# Altium footprint library Generic Footprint.PcbLib: 160 footprints (part 15 of 20) (continued)
## Symbol_FCC-Logo-3x2mm_Silkscreen [mm] (continued)
1(0.376,0.862) 1(0.376,0.865) 1(0.376,0.869) 1(0.376,0.872) 1(0.376,0.875) 1(0.376,0.879) 1(0.376,0.882) 1(0.376,0.886) 1(0.376,0.889) 1(0.376,0.892) 1(0.376,0.896) 1(0.376,0.899) 1(0.376,0.903) 1(0.376,0.906) 1(0.376,0.913) 1(0.376,1.181) 1(0.376,1.722) 1(0.376,1.725) 1(0.376,1.729) 1(0.376,1.732) 1(0.376,1.736) 1(0.376,1.739) 1(0.379,0.913) 1(0.379,0.916) 1(0.379,0.92) 1(0.379,1.181) 1(0.379,1.725) 1(0.379,1.729) 1(0.379,1.732) 1(0.379,1.742) 1(0.382,0.926) 1(0.382,1.178) 1(0.382,1.185) 1(0.382,1.739) 1(0.382,1.742) 1(0.382,1.749) 1(0.386,1.739) 1(0.386,1.742) 1(0.386,1.746) 1(0.386,1.749) 1(0.389,1.756) 1(0.393,1.749) 1(0.393,1.756) 1(0.393,1.759) 1(0.396,0.92) 1(0.396,0.923) 1(0.396,0.926) 1(0.396,1.753) 1(0.396,1.759) 1(0.399,1.763) 1(0.403,1.756) 1(0.403,1.763) 1(0.406,1.759) 1(0.41,1.763) 1(0.413,1.766) 1(0.413,1.773) 1(0.42,1.77) 1(0.42,1.773) 1(0.42,1.776) 1(0.427,1.773) 1(0.427,1.776) 1(0.427,1.78) 1(1.035,1.178) 1(1.035,1.185) 1(1.039,0.923) 1(1.042,0.892) 1(1.042,0.896) 1(1.042,0.899) 1(1.042,0.903) 1(1.042,0.906) 1(1.042,0.909) 1(1.042,0.913) 1(1.042,0.916) 1(1.042,1.185) 1(1.042,1.195) 1(1.042,1.198) 1(1.042,1.202) 1(1.042,1.205) 1(1.042,1.209) 1(1.042,1.212) 1(1.045,0.869) 1(1.045,0.872) 1(1.045,0.875) 1(1.045,0.879) 1(1.045,0.882) 1(1.045,0.886) 1(1.045,0.892) 1(1.045,0.896) 1(1.045,0.899) 1(1.045,0.903) 1(1.045,0.906) 1(1.045,0.909) 1(1.045,0.913) 1(1.045,1.185) 1(1.045,1.188) 1(1.045,1.195) 1(1.045,1.198) 1(1.045,1.202) 1(1.045,1.205) 1(1.045,1.209) 1(1.045,1.212) 1(1.045,1.219) 1(1.045,1.222) 1(1.045,1.226) 1(1.045,1.229) 1(1.045,1.232) 1(1.049,0.852) 1(1.049,0.855) 1(1.049,0.858) 1(1.049,0.862) 1(1.049,0.869) 1(1.049,0.872) 1(1.049,0.875) 1(1.049,0.879) 1(1.049,0.882) 1(1.049,0.886) 1(1.049,0.889) 1(1.049,0.892) 1(1.049,0.896) 1(1.049,0.899) 1(1.049,0.903) 1(1.049,0.906) 1(1.049,0.909) 1(1.049,0.913) 1(1.049,1.192) 1(1.049,1.195) 1(1.049,1.198) 1(1.049,1.202) 1(1.049,1.205) 1(1.049,1.209) 1(1.049,1.212) 1(1.049,1.215) 1(1.049,1.219) 1(1.049,1.222) 1(1.049,1.226) 1(1.049,1.229) 1(1.049,1.232) 1(1.049,1.239) 1(1.049,1.243) 1(1.049,1.246) 1(1.049,1.249) 1(1.049,1.253) 1(1.052,0.838) 1(1.052,0.845) 1(1.052,0.886) 1(1.052,1.219) 1(1.052,1.253) 1(1.052,1.256) 1(1.052,1.27) 1(1.056,0.818) 1(1.056,0.821) 1(1.056,0.824) 1(1.056,0.828) 1(1.056,0.831) 1(1.056,0.835) 1(1.056,0.841) 1(1.056,0.852) 1(1.056,0.855) 1(1.056,0.858) 1(1.056,0.862) 1(1.056,0.865) 1(1.056,0.869) 1(1.056,0.872) 1(1.056,0.875) 1(1.056,0.879) 1(1.056,0.882) 1(1.056,1.222) 1(1.056,1.226) 1(1.056,1.229) 1(1.056,1.232) 1(1.056,1.236) 1(1.056,1.239) 1(1.056,1.243) 1(1.056,1.246) 1(1.056,1.249) 1(1.056,1.256) 1(1.056,1.26) 1(1.056,1.263) 1(1.056,1.266) 1(1.056,1.273) 1(1.056,1.277) 1(1.056,1.28) 1(1.056,1.283) 1(1.056,1.287) 1(1.059,0.804) 1(1.059,0.807) 1(1.059,0.811) 1(1.059,0.814) 1(1.059,0.835) 1(1.059,0.838) 1(1.059,0.841) 1(1.059,0.845) 1(1.059,0.848) 1(1.059,0.852) 1(1.059,0.855) 1(1.059,0.858) 1(1.059,0.862) 1(1.059,1.239) 1(1.059,1.243) 1(1.059,1.246) 1(1.059,1.249) 1(1.059,1.253) 1(1.059,1.256) 1(1.059,1.26) 1(1.059,1.263) 1(1.059,1.266) 1(1.059,1.27) 1(1.059,1.273) 1(1.059,1.29) 1(1.059,1.294) 1(1.059,1.297) 1(1.059,1.3) 1(1.062,0.787) 1(1.062,0.79) 1(1.062,0.794) 1(1.062,0.797) 1(1.062,0.801) 1(1.062,0.818) 1(1.062,0.828) 1(1.062,0.835) 1(1.062,0.838) 1(1.062,0.841) 1(1.062,0.845) 1(1.062,1.26) 1(1.062,1.263) 1(1.062,1.266) 1(1.062,1.27) 1(1.062,1.273) 1(1.062,1.28) 1(1.062,1.283) 1(1.062,1.287) 1(1.062,1.304) 1(1.062,1.307) 1(1.062,1.311) 1(1.062,1.314) 1(1.062,1.317) 1(1.066,0.818) 1(1.066,0.828) 1(1.066,1.28) 1(1.066,1.283) 1(1.066,1.287) 1(1.069,0.777) 1(1.069,0.78) 1(1.069,0.784) 1(1.069,1.321) 1(1.069,1.324) 1(1.069,1.328) 1(1.073,0.76) 1(1.073,0.763) 1(1.073,0.767) 1(1.073,0.77) 1(1.073,0.777) 1(1.073,0.78) 1(1.073,1.324) 1(1.073,1.328) 1(1.073,1.334) 1(1.073,1.338) 1(1.073,1.341) 1(1.073,1.345) 1(1.076,0.75) 1(1.076,0.753) 1(1.076,0.76) 1(1.076,0.763) 1(1.076,0.767) 1(1.076,0.77) 1(1.076,0.773) 1(1.076,0.777) 1(1.076,0.78) 1(1.076,1.324) 1(1.076,1.328) 1(1.076,1.334) 1(1.076,1.338) 1(1.076,1.341) 1(1.076,1.345) 1(1.076,1.351) 1(1.079,0.739) 1(1.079,0.743) 1(1.079,0.75) 1(1.079,0.753) 1(1.079,0.76) 1(1.079,0.763) 1(1.079,0.767) 1(1.079,0.77) 1(1.079,1.331) 1(1.079,1.334) 1(1.079,1.338) 1(1.079,1.341) 1(1.079,1.345) 1(1.079,1.351) 1(1.079,1.358) 1(1.079,1.362) 1(1.079,1.365) 1(1.083,0.726) 1(1.083,0.729) 1(1.083,0.733) 1(1.083,0.739) 1(1.083,0.743) 1(1.083,0.75) 1(1.083,0.753) 1(1.083,0.756) 1(1.083,1.348) 1(1.083,1.351) 1(1.083,1.355) 1(1.083,1.358) 1(1.083,1.362) 1(1.083,1.365) 1(1.083,1.372) 1(1.083,1.375) 1(1.086,0.719) 1(1.086,0.722) 1(1.086,0.746) 1(1.086,1.358) 1(1.086,1.368) 1(1.086,1.375) 1(1.086,1.379) 1(1.086,1.382) 1(1.086,1.385) 1(1.09,0.705) 1(1.09,0.709) 1(1.09,0.712) 1(1.09,0.716) 1(1.09,0.726) 1(1.09,0.729) 1(1.09,0.736) 1(1.09,0.739) 1(1.09,0.743) 1(1.09,1.362) 1(1.09,1.365) 1(1.09,1.372) 1(1.09,1.389) 1(1.09,1.392) 1(1.09,1.396) 1(1.09,1.399) 1(1.09,2.13) 1(1.093,0.692) 1(1.093,0.695) 1(1.093,0.699) 1(1.093,0.702) 1(1.093,0.716) 1(1.093,0.719) 1(1.093,0.726) 1(1.093,0.729) 1(1.093,1.372) 1(1.093,1.375) 1(1.093,1.382) 1(1.093,1.385) 1(1.093,1.389) 1(1.093,1.402) 1(1.093,1.406) 1(1.093,1.409) 1(1.093,2.123) 1(1.093,2.127) 1(1.093,2.13) 1(1.096,0.688) 1(1.096,0.692) 1(1.096,0.695) 1(1.096,0.716) 1(1.096,0.719) 1(1.096,1.382) 1(1.096,1.385) 1(1.096,1.389) 1(1.096,1.409) 1(1.096,1.413) 1(1.096,1.416) 1(1.096,1.787) 1(1.096,1.79) 1(1.096,1.793) 1(1.096,1.797) 1(1.096,1.8) 1(1.096,1.804) 1(1.096,1.807) 1(1.096,1.81) 1(1.096,1.814) 1(1.096,1.817) 1(1.096,1.821) 1(1.096,1.824) 1(1.096,1.827) 1(1.096,1.831) 1(1.096,1.834) 1(1.096,1.838) 1(1.096,1.841) 1(1.096,1.844) 1(1.096,1.848) 1(1.096,1.851) 1(1.096,1.855) 1(1.096,1.858) 1(1.096,1.861) 1(1.096,1.865) 1(1.096,1.868) 1(1.096,1.872) 1(1.096,1.875) 1(1.096,1.878) 1(1.096,1.882) 1(1.096,1.885) 1(1.096,1.889) 1(1.096,1.892) 1(1.096,1.895) 1(1.096,1.899) 1(1.096,1.902) 1(1.096,1.906) 1(1.096,1.909) 1(1.096,1.912) 1(1.096,1.916) 1(1.096,1.919) 1(1.096,1.923) 1(1.096,1.926) 1(1.096,1.929) 1(1.096,1.933) 1(1.096,1.936) 1(1.096,1.94) 1(1.096,1.943) 1(1.096,1.946) 1(1.096,1.95) 1(1.096,1.953) 1(1.096,1.957) 1(1.096,1.96) 1(1.096,1.963) 1(1.096,1.967) 1(1.096,1.97) 1(1.096,1.974) 1(1.096,1.977) 1(1.096,1.98) 1(1.096,1.984) 1(1.096,1.987) 1(1.096,1.991) 1(1.096,1.994) 1(1.096,1.997) 1(1.096,2.001) 1(1.096,2.004) 1(1.096,2.008) 1(1.096,2.011) 1(1.096,2.014) 1(1.096,2.018) 1(1.096,2.021) 1(1.096,2.025) 1(1.096,2.028) 1(1.096,2.031) 1(1.096,2.035) 1(1.096,2.038) 1(1.096,2.042) 1(1.096,2.045) 1(1.096,2.048) 1(1.096,2.052) 1(1.096,2.055) 1(1.096,2.059) 1(1.096,2.062) 1(1.096,2.065) 1(1.096,2.069) 1(1.096,2.072) 1(1.096,2.076) 1(1.096,2.079) 1(1.096,2.082) 1(1.096,2.086) 1(1.096,2.089) 1(1.096,2.093) 1(1.096,2.096) 1(1.096,2.099) 1(1.096,2.103) 1(1.096,2.106) 1(1.096,2.11) 1(1.096,2.113) 1(1.096,2.116) 1(1.096,2.12) 1(1.096,2.123) 1(1.096,2.127) 1(1.096,2.13) 1(1.096,2.133) 1(1.1,0.688) 1(1.1,0.692) 1(1.1,0.695) 1(1.1,1.409) 1(1.1,1.416) 1(1.1,1.426) 1(1.1,1.787) 1(1.1,1.79) 1(1.1,1.793) 1(1.1,1.797) 1(1.1,1.8) 1(1.1,1.804) 1(1.1,1.807) 1(1.1,1.81) 1(1.1,1.814) 1(1.1,1.817) 1(1.1,1.821) 1(1.1,1.824) 1(1.1,1.827) 1(1.1,1.831) 1(1.1,1.834) 1(1.1,1.838) 1(1.1,1.841) 1(1.1,1.844) 1(1.1,1.848) 1(1.1,1.851) 1(1.1,1.855) 1(1.1,1.858) 1(1.1,1.861) 1(1.1,1.865) 1(1.1,1.868) 1(1.1,1.872) 1(1.1,1.875) 1(1.1,1.878) 1(1.1,1.882) 1(1.1,1.885) 1(1.1,1.889) 1(1.1,1.892) 1(1.1,1.895) 1(1.1,1.899) 1(1.1,1.902) 1(1.1,1.906) 1(1.1,1.909) 1(1.1,1.912) 1(1.1,1.916) 1(1.1,1.919) 1(1.1,1.923) 1(1.1,1.926) 1(1.1,1.929) 1(1.1,1.933) 1(1.1,1.936) 1(1.1,1.94) 1(1.1,1.943) 1(1.1,1.946) 1(1.1,1.95) 1(1.1,1.953) 1(1.1,1.957) 1(1.1,1.96) 1(1.1,1.963) 1(1.1,1.967) 1(1.1,1.97) 1(1.1,1.974) 1(1.1,1.977) 1(1.1,1.98) 1(1.1,1.984) 1(1.1,1.987) 1(1.1,1.991) 1(1.1,1.994) 1(1.1,1.997) 1(1.1,2.001) 1(1.1,2.004) 1(1.1,2.008) 1(1.1,2.011) 1(1.1,2.014) 1(1.1,2.018) 1(1.1,2.021) 1(1.1,2.025) 1(1.1,2.028) 1(1.1,2.031) 1(1.1,2.035) 1(1.1,2.038) 1(1.1,2.042) 1(1.1,2.045) 1(1.1,2.048) 1(1.1,2.052) 1(1.1,2.055) 1(1.1,2.059) 1(1.1,2.062) 1(1.1,2.065) 1(1.1,2.069) 1(1.1,2.072) 1(1.1,2.076) 1(1.1,2.079) 1(1.1,2.082) 1(1.1,2.086) 1(1.1,2.089) 1(1.1,2.093) 1(1.1,2.096) 1(1.1,2.099) 1(1.1,2.103) 1(1.1,2.106) 1(1.1,2.11) 1(1.1,2.113) 1(1.1,2.116) 1(1.1,2.123) 1(1.1,2.127) 1(1.103,0.675) 1(1.103,0.678) 1(1.103,0.682) 1(1.103,1.423) 1(1.103,1.43) 1(1.103,1.787) 1(1.103,1.79) 1(1.103,1.793) 1(1.103,1.797) 1(1.103,1.8) 1(1.103,1.804) 1(1.103,1.807) 1(1.103,1.81) 1(1.103,1.814) 1(1.103,1.817) 1(1.103,1.821) 1(1.103,1.824) 1(1.103,1.827) 1(1.103,1.831) 1(1.103,1.834) 1(1.103,1.838) 1(1.103,1.841) 1(1.103,1.844) 1(1.103,1.848) 1(1.103,1.851) 1(1.103,1.855) 1(1.103,1.858) 1(1.103,1.861) 1(1.103,1.865) 1(1.103,1.868) 1(1.103,1.872) 1(1.103,1.875) 1(1.103,1.878) 1(1.103,1.882) 1(1.103,1.885) 1(1.103,1.889) 1(1.103,1.892) 1(1.103,1.895) 1(1.103,1.899) 1(1.103,1.902) 1(1.103,1.906) 1(1.103,1.909) 1(1.103,1.912) 1(1.103,1.916) 1(1.103,1.919) 1(1.103,1.923) 1(1.103,1.926) 1(1.103,1.929) 1(1.103,1.933) 1(1.103,1.936) 1(1.103,1.94) 1(1.103,1.943) 1(1.103,1.946) 1(1.103,1.95) 1(1.103,1.953) 1(1.103,1.957) 1(1.103,1.96) 1(1.103,1.963) 1(1.103,1.967) 1(1.103,1.97) 1(1.103,1.974) 1(1.103,1.977) 1(1.103,1.98) 1(1.103,1.984) 1(1.103,1.987) 1(1.103,1.991) 1(1.103,1.994) 1(1.103,1.997) 1(1.103,2.001) 1(1.103,2.004) 1(1.103,2.008) 1(1.103,2.011) 1(1.103,2.014) 1(1.103,2.018) 1(1.103,2.021) 1(1.103,2.025) 1(1.103,2.028) 1(1.103,2.031) 1(1.103,2.035) 1(1.103,2.038) 1(1.103,2.042) 1(1.103,2.045) 1(1.103,2.048) 1(1.103,2.052) 1(1.103,2.055) 1(1.103,2.059) 1(1.103,2.062) 1(1.103,2.065) 1(1.103,2.069) 1(1.103,2.072) 1(1.103,2.076) 1(1.103,2.079) 1(1.103,2.082) 1(1.103,2.086) 1(1.103,2.089) 1(1.103,2.093) 1(1.103,2.096) 1(1.103,2.099) 1(1.103,2.103) 1(1.103,2.106) 1(1.103,2.11) 1(1.103,2.113) 1(1.107,0.668) 1(1.107,0.675) 1(1.107,0.678) 1(1.107,0.682) 1(1.107,0.685) 1(1.107,0.688) 1(1.107,1.416) 1(1.107,1.419) 1(1.107,1.423) 1(1.107,1.426) 1(1.107,1.43) 1(1.107,1.436) 1(1.107,1.78) 1(1.107,1.783) 1(1.107,2.116) 1(1.11,0.651) 1(1.11,0.658) 1(1.11,0.661) 1(1.11,0.668) 1(1.11,0.675) 1(1.11,0.678) 1(1.11,0.682) 1(1.11,1.423) 1(1.11,1.426) 1(1.11,1.43) 1(1.11,1.436) 1(1.11,1.443) 1(1.11,1.447) 1(1.11,1.78) 1(1.113,0.644) 1(1.113,0.658) 1(1.113,0.661) 1(1.113,0.668) 1(1.113,0.671) 1(1.113,1.433) 1(1.113,1.436) 1(1.113,1.443) 1(1.113,1.447) 1(1.113,1.453) 1(1.113,1.464) 1(1.113,1.776) 1(1.117,0.641) 1(1.117,0.651) 1(1.117,0.654) 1(1.117,0.658) 1(1.117,0.661) 1(1.117,0.665) 1(1.117,1.44) 1(1.117,1.443) 1(1.117,1.447) 1(1.117,1.45) 1(1.117,1.453) 1(1.117,1.46) 1(1.117,1.47) 1(1.12,0.631) 1(1.12,0.634) 1(1.12,0.637) 1(1.12,1.467) 1(1.124,0.624) 1(1.124,0.627) 1(1.124,0.648) 1(1.124,0.651) 1(1.124,1.453) 1(1.124,1.457) 1(1.124,1.474) 1(1.124,1.477) 1(1.124,1.481) 1(1.127,0.617) 1(1.127,0.62) 1(1.127,0.624) 1(1.127,1.481) 1(1.127,1.484) 1(1.127,1.487) 1(1.13,0.607) 1(1.13,0.61) 1(1.13,0.617) 1(1.13,0.62) 1(1.13,0.624) 1(1.13,1.481) 1(1.13,1.484) 1(1.13,1.487) 1(1.13,1.494) 1(1.134,0.603) 1(1.134,0.607) 1(1.134,0.61) 1(1.134,0.614) 1(1.134,0.617) 1(1.134,0.62) 1(1.134,1.484) 1(1.134,1.487) 1(1.134,1.494) 1(1.134,1.501) 1(1.137,1.491) 1(1.141,0.586) 1(1.141,0.593) 1(1.141,0.603) 1(1.141,0.607) 1(1.141,0.61) 1(1.141,1.494) 1(1.141,1.498) 1(1.141,1.501) 1(1.141,1.508) 1(1.141,1.511) 1(1.144,0.58) 1(1.144,0.583) 1(1.144,0.593) 1(1.144,0.6) 1(1.144,0.603) 1(1.144,1.501) 1(1.144,1.504) 1(1.144,1.508) 1(1.144,1.511) 1(1.144,1.518) 1(1.144,1.521) 1(1.147,0.573) 1(1.147,0.576) 1(1.147,0.583) 1(1.147,0.586) 1(1.147,0.593) 1(1.147,0.597) 1(1.147,1.508) 1(1.147,1.511) 1(1.147,1.518) 1(1.147,1.521) 1(1.147,1.525) 1(1.147,1.528) 1(1.147,1.532) 1(1.151,0.566) 1(1.151,0.583) 1(1.151,0.586) 1(1.151,0.59) 1(1.151,1.515) 1(1.151,1.518) 1(1.151,1.521) 1(1.151,1.538) 1(1.154,0.569) 1(1.154,1.535) 1(1.158,0.556) 1(1.158,0.559) 1(1.158,0.563) 1(1.158,1.542) 1(1.158,1.545) 1(1.158,1.549) 1(1.161,0.552) 1(1.161,0.556) 1(1.161,0.559) 1(1.161,1.542) 1(1.161,1.545) 1(1.161,1.552) 1(1.164,0.546) 1(1.164,0.552) 1(1.164,0.556) 1(1.164,0.559) 1(1.164,1.542) 1(1.164,1.545) 1(1.164,1.552) 1(1.168,0.539) 1(1.168,0.546) 1(1.168,0.552) 1(1.168,1.552) 1(1.168,1.566) 1(1.171,0.529) 1(1.171,0.532) 1(1.171,0.542) 1(1.171,1.562) 1(1.171,1.569) 1(1.171,1.572) 1(1.175,0.535) 1(1.175,0.539) 1(1.175,0.546) 1(1.175,0.549) 1(1.175,1.555) 1(1.175,1.559) 1(1.175,1.566) 1(1.175,1.576) 1(1.178,0.518) 1(1.178,0.522) 1(1.178,0.525) 1(1.178,0.529) 1(1.178,0.532) 1(1.178,0.539) 1(1.178,1.566) 1(1.178,1.569) 1(1.178,1.572) 1(1.178,1.576) 1(1.178,1.579) 1(1.178,1.583) 1(1.181,0.515) 1(1.181,0.529) 1(1.181,0.532) 1(1.181,1.569) 1(1.181,1.572) 1(1.181,1.576) 1(1.181,1.586) 1(1.181,1.589) 1(1.185,0.512) 1(1.185,0.515) 1(1.185,1.589) 1(1.185,1.593) 1(1.188,0.515) 1(1.192,0.498) 1(1.192,0.501) 1(1.192,0.505) 1(1.192,0.512) 1(1.192,1.589) 1(1.192,1.6) 1(1.192,1.603) 1(1.195,0.498) 1(1.195,0.501) 1(1.195,0.505) 1(1.195,0.508) 1(1.195,0.512) 1(1.195,1.596) 1(1.195,1.6) 1(1.195,1.603) 1(1.195,1.606) 1(1.198,0.488) 1(1.198,0.491) 1(1.198,0.501) 1(1.198,0.505) 1(1.198,1.6) 1(1.198,1.603) 1(1.198,1.606) 1(1.198,1.613) 1(1.198,1.617) 1(1.202,0.491) 1(1.202,0.495) 1(1.202,0.498) 1(1.202,1.606) 1(1.202,1.613) 1(1.205,0.478) 1(1.205,0.481) 1(1.205,0.484) 1(1.205,0.491) 1(1.205,1.61) 1(1.205,1.617) 1(1.205,1.62) 1(1.205,1.623) 1(1.205,1.627) 1(1.209,0.481) 1(1.209,1.613) 1(1.209,1.617) 1(1.209,1.623) 1(1.212,0.467) 1(1.212,0.471) 1(1.212,0.474) 1(1.212,0.481) 1(1.212,1.623) 1(1.212,1.63) 1(1.212,1.634) 1(1.212,1.637) 1(1.215,0.464) 1(1.215,1.634) 1(1.215,1.64) 1(1.219,0.461) 1(1.219,1.634) 1(1.219,1.64) 1(1.222,1.64) 1(1.222,1.644) 1(1.222,1.647) 1(1.222,1.651) 1(1.226,0.45) 1(1.226,0.454) 1(1.226,1.644) 1(1.226,1.647) 1(1.226,1.654) 1(1.229,0.444) 1(1.229,0.45) 1(1.229,0.454) 1(1.229,1.644) 1(1.229,1.647) 1(1.229,1.651) 1(1.232,0.437) 1(1.232,0.44) 1(1.232,0.454) 1(1.232,0.457) 1(1.232,1.651) 1(1.232,1.654) 1(1.232,1.661) 1(1.232,1.664) 1(1.236,0.433) 1(1.236,0.44) 1(1.236,0.444) 1(1.236,0.447) 1(1.236,0.45) 1(1.236,1.654) 1(1.236,1.657) 1(1.236,1.661) 1(1.236,1.668) 1(1.239,0.444) 1(1.239,1.661) 1(1.239,1.664) 1(1.239,1.671) 1(1.243,0.427) 1(1.243,0.43) 1(1.243,0.44) 1(1.243,1.664) 1(1.243,1.674) 1(1.243,1.678) 1(1.246,0.423) 1(1.246,0.427) 1(1.246,0.43) 1(1.246,1.674) 1(1.246,1.681) 1(1.249,0.42) 1(1.249,0.423) 1(1.249,0.43) 1(1.249,1.674) 1(1.249,1.678) 1(1.249,1.681) 1(1.249,1.685) 1(1.253,0.416) 1(1.253,0.42) 1(1.253,0.427) 1(1.253,1.678) 1(1.253,1.681) 1(1.253,1.685) 1(1.253,1.688) 1(1.256,0.41) 1(1.256,0.416) 1(1.256,0.423) 1(1.256,1.695) 1(1.26,0.403) 1(1.26,0.406) 1(1.26,0.42) 1(1.26,1.685) 1(1.26,1.688) 1(1.26,1.698) 1(1.263,0.399) 1(1.263,0.406) 1(1.263,0.41) 1(1.263,0.413) 1(1.263,0.416) 1(1.263,1.688) 1(1.263,1.695) 1(1.263,1.698) 1(1.263,1.702) 1(1.266,0.396) 1(1.266,0.403) 1(1.266,0.406) 1(1.266,0.41) 1(1.266,1.691) 1(1.266,1.695) 1(1.266,1.702) 1(1.266,1.705) 1(1.27,0.399) 1(1.27,0.403) 1(1.27,1.698) 1(1.27,1.702) 1(1.27,1.712) 1(1.273,1.708) 1(1.273,1.715) 1(1.277,0.386) 1(1.277,0.389) 1(1.277,0.393) 1(1.277,0.399) 1(1.277,1.719) 1(1.28,0.382) 1(1.28,0.386) 1(1.28,0.389) 1(1.28,1.719) 1(1.28,1.722) 1(1.283,0.379) 1(1.283,0.382) 1(1.283,0.386) 1(1.283,0.389) 1(1.283,1.719) 1(1.283,1.722) 1(1.283,1.725) 1(1.287,0.376) 1(1.287,0.379) 1(1.287,0.382) 1(1.287,1.722) 1(1.287,1.725) 1(1.287,1.729) 1(1.29,0.369) 1(1.29,0.372) 1(1.29,0.376) 1(1.29,1.729) 1(1.29,1.732) 1(1.294,0.365) 1(1.294,0.376) 1(1.294,0.379) 1(1.294,1.022) 1(1.294,1.025) 1(1.294,1.028) 1(1.294,1.032) 1(1.294,1.035) 1(1.294,1.039) 1(1.294,1.042) 1(1.294,1.045) 1(1.294,1.049) 1(1.294,1.052) 1(1.294,1.056) 1(1.294,1.059) 1(1.294,1.062) 1(1.294,1.066) 1(1.294,1.069) 1(1.294,1.073) 1(1.294,1.076) 1(1.294,1.079) 1(1.294,1.083) 1(1.294,1.725) 1(1.294,1.736) 1(1.297,0.362) 1(1.297,0.369) 1(1.297,0.971) 1(1.297,0.974) 1(1.297,0.977) 1(1.297,0.981) 1(1.297,0.984) 1(1.297,0.988) 1(1.297,0.991) 1(1.297,0.994) 1(1.297,0.998) 1(1.297,1.001) 1(1.297,1.005) 1(1.297,1.008) 1(1.297,1.011) 1(1.297,1.015) 1(1.297,1.018) 1(1.297,1.025) 1(1.297,1.028) 1(1.297,1.032) 1(1.297,1.035) 1(1.297,1.039) 1(1.297,1.042) 1(1.297,1.045) 1(1.297,1.049) 1(1.297,1.052) 1(1.297,1.056) 1(1.297,1.059) 1(1.297,1.062) 1(1.297,1.066) 1(1.297,1.069) 1(1.297,1.073) 1(1.297,1.076) 1(1.297,1.079) 1(1.297,1.086) 1(1.297,1.09) 1(1.297,1.093) 1(1.297,1.096) 1(1.297,1.1) 1(1.297,1.103) 1(1.297,1.107) 1(1.297,1.11) 1(1.297,1.113) 1(1.297,1.117) 1(1.297,1.12) 1(1.297,1.124) 1(1.297,1.127) 1(1.297,1.13) 1(1.297,1.134) 1(1.297,1.729) 1(1.297,1.736) 1(1.297,1.739) 1(1.297,1.742) 1(1.3,0.365) 1(1.3,0.369) 1(1.3,0.943) 1(1.3,0.947) 1(1.3,0.95) 1(1.3,0.954) 1(1.3,0.957) 1(1.3,0.96) 1(1.3,0.964) 1(1.3,0.971) 1(1.3,0.974) 1(1.3,0.977) 1(1.3,0.981) 1(1.3,0.984) 1(1.3,0.988) 1(1.3,0.991) 1(1.3,0.994) 1(1.3,0.998) 1(1.3,1.001) 1(1.3,1.005) 1(1.3,1.008) 1(1.3,1.011) 1(1.3,1.015) 1(1.3,1.025) 1(1.3,1.028) 1(1.3,1.032) 1(1.3,1.035) 1(1.3,1.039) 1(1.3,1.042) 1(1.3,1.045) 1(1.3,1.049) 1(1.3,1.052) 1(1.3,1.056) 1(1.3,1.059) 1(1.3,1.062) 1(1.3,1.066) 1(1.3,1.069) 1(1.3,1.073) 1(1.3,1.076) 1(1.3,1.079) 1(1.3,1.09) 1(1.3,1.093) 1(1.3,1.096) 1(1.3,1.1) 1(1.3,1.103) 1(1.3,1.107) 1(1.3,1.11) 1(1.3,1.113) 1(1.3,1.117) 1(1.3,1.12) 1(1.3,1.124) 1(1.3,1.127) 1(1.3,1.13) 1(1.3,1.134) 1(1.3,1.137) 1(1.3,1.141) 1(1.3,1.144) 1(1.3,1.147) 1(1.3,1.151) 1(1.3,1.154) 1(1.3,1.158) 1(1.3,1.161) 1(1.3,1.164) 1(1.3,1.736) 1(1.3,1.742) 1(1.3,1.746) 1(1.304,0.355) 1(1.304,0.365) 1(1.304,0.92) 1(1.304,0.923) 1(1.304,0.926) 1(1.304,0.93) 1(1.304,0.933) 1(1.304,0.937) 1(1.304,0.943) 1(1.304,0.947) 1(1.304,0.95) 1(1.304,0.954) 1(1.304,0.957) 1(1.304,0.96) 1(1.304,0.964) 1(1.304,0.967) 1(1.304,0.971) 1(1.304,0.974) 1(1.304,0.977) 1(1.304,0.981) 1(1.304,0.984) 1(1.304,0.988) 1(1.304,0.991) 1(1.304,0.994) 1(1.304,0.998) 1(1.304,1.001) 1(1.304,1.005) 1(1.304,1.008) 1(1.304,1.011) 1(1.304,1.015) 1(1.304,1.09) 1(1.304,1.093) 1(1.304,1.096) 1(1.304,1.1) 1(1.304,1.103) 1(1.304,1.107) 1(1.304,1.11) 1(1.304,1.113) 1(1.304,1.117) 1(1.304,1.12) 1(1.304,1.124) 1(1.304,1.127) 1(1.304,1.13) 1(1.304,1.134) 1(1.304,1.141) 1(1.304,1.144) 1(1.304,1.147) 1(1.304,1.151) 1(1.304,1.154) 1(1.304,1.158) 1(1.304,1.161) 1(1.304,1.164) 1(1.304,1.171) 1(1.304,1.175) 1(1.304,1.178) 1(1.304,1.181) 1(1.304,1.185) 1(1.304,1.742) 1(1.304,1.749) 1(1.304,1.753) 1(1.307,0.348) 1(1.307,0.352) 1(1.307,0.359) 1(1.307,0.94) 1(1.307,0.943) 1(1.307,0.947) 1(1.307,0.95) 1(1.307,0.954) 1(1.307,0.957) 1(1.307,0.96) 1(1.307,0.964) 1(1.307,1.144) 1(1.307,1.147) 1(1.307,1.151) 1(1.307,1.154) 1(1.307,1.158) 1(1.307,1.161) 1(1.307,1.164) 1(1.307,1.168) 1(1.311,0.345) 1(1.311,0.352) 1(1.311,0.903) 1(1.311,0.913) 1(1.311,0.92) 1(1.311,0.923) 1(1.311,0.926) 1(1.311,0.93) 1(1.311,0.933) 1(1.311,0.937) 1(1.311,1.141) 1(1.311,1.168) 1(1.311,1.171) 1(1.311,1.175) 1(1.311,1.178) 1(1.311,1.181) 1(1.311,1.185) 1(1.311,1.192) 1(1.311,1.202) 1(1.311,1.756) 1(1.314,0.348) 1(1.314,0.352) 1(1.314,0.872) 1(1.314,0.875) 1(1.314,0.879) 1(1.314,0.903) 1(1.314,0.916) 1(1.314,0.92) 1(1.314,0.923) 1(1.314,0.926) 1(1.314,0.93) 1(1.314,0.933) 1(1.314,0.937) 1(1.314,1.168) 1(1.314,1.171) 1(1.314,1.175) 1(1.314,1.178) 1(1.314,1.181) 1(1.314,1.185) 1(1.314,1.188) 1(1.314,1.192) 1(1.314,1.202) 1(1.314,1.226) 1(1.314,1.236) 1(1.314,1.756) 1(1.314,1.759) 1(1.317,0.342) 1(1.317,0.345) 1(1.317,0.348) 1(1.317,0.855) 1(1.317,0.858) 1(1.317,0.865) 1(1.317,0.872) 1(1.317,0.875) 1(1.317,0.879) 1(1.317,0.896) 1(1.317,0.899) 1(1.317,0.903) 1(1.317,0.906) 1(1.317,0.909) 1(1.317,1.192) 1(1.317,1.195) 1(1.317,1.198) 1(1.317,1.202) 1(1.317,1.205) 1(1.317,1.209) 1(1.317,1.226) 1(1.317,1.236) 1(1.317,1.243) 1(1.317,1.246) 1(1.317,1.249) 1(1.317,1.756) 1(1.317,1.759) 1(1.317,1.763) 1(1.321,0.335) 1(1.321,0.338) 1(1.321,0.342) 1(1.321,0.345) 1(1.321,0.838) 1(1.321,0.841) 1(1.321,0.845) 1(1.321,0.848) 1(1.321,0.855) 1(1.321,0.858) 1(1.321,0.865) 1(1.321,0.879) 1(1.321,0.882) 1(1.321,0.886) 1(1.321,0.889) 1(1.321,0.892) 1(1.321,1.212) 1(1.321,1.215) 1(1.321,1.219) 